# Altium footprint library DrPCB.PcbLib: 910 footprints (part 19 of 57)
Each footprint in its own frame and in the unit in brackets; x right, y up, seen from the top. Pads: shape width x height; smd on the part's side, far side on the other; paste and mask are expansions set on the pad; w line width, h text height; cw(c..) or ccw(c..) is an arc to the next point about the centre after c.
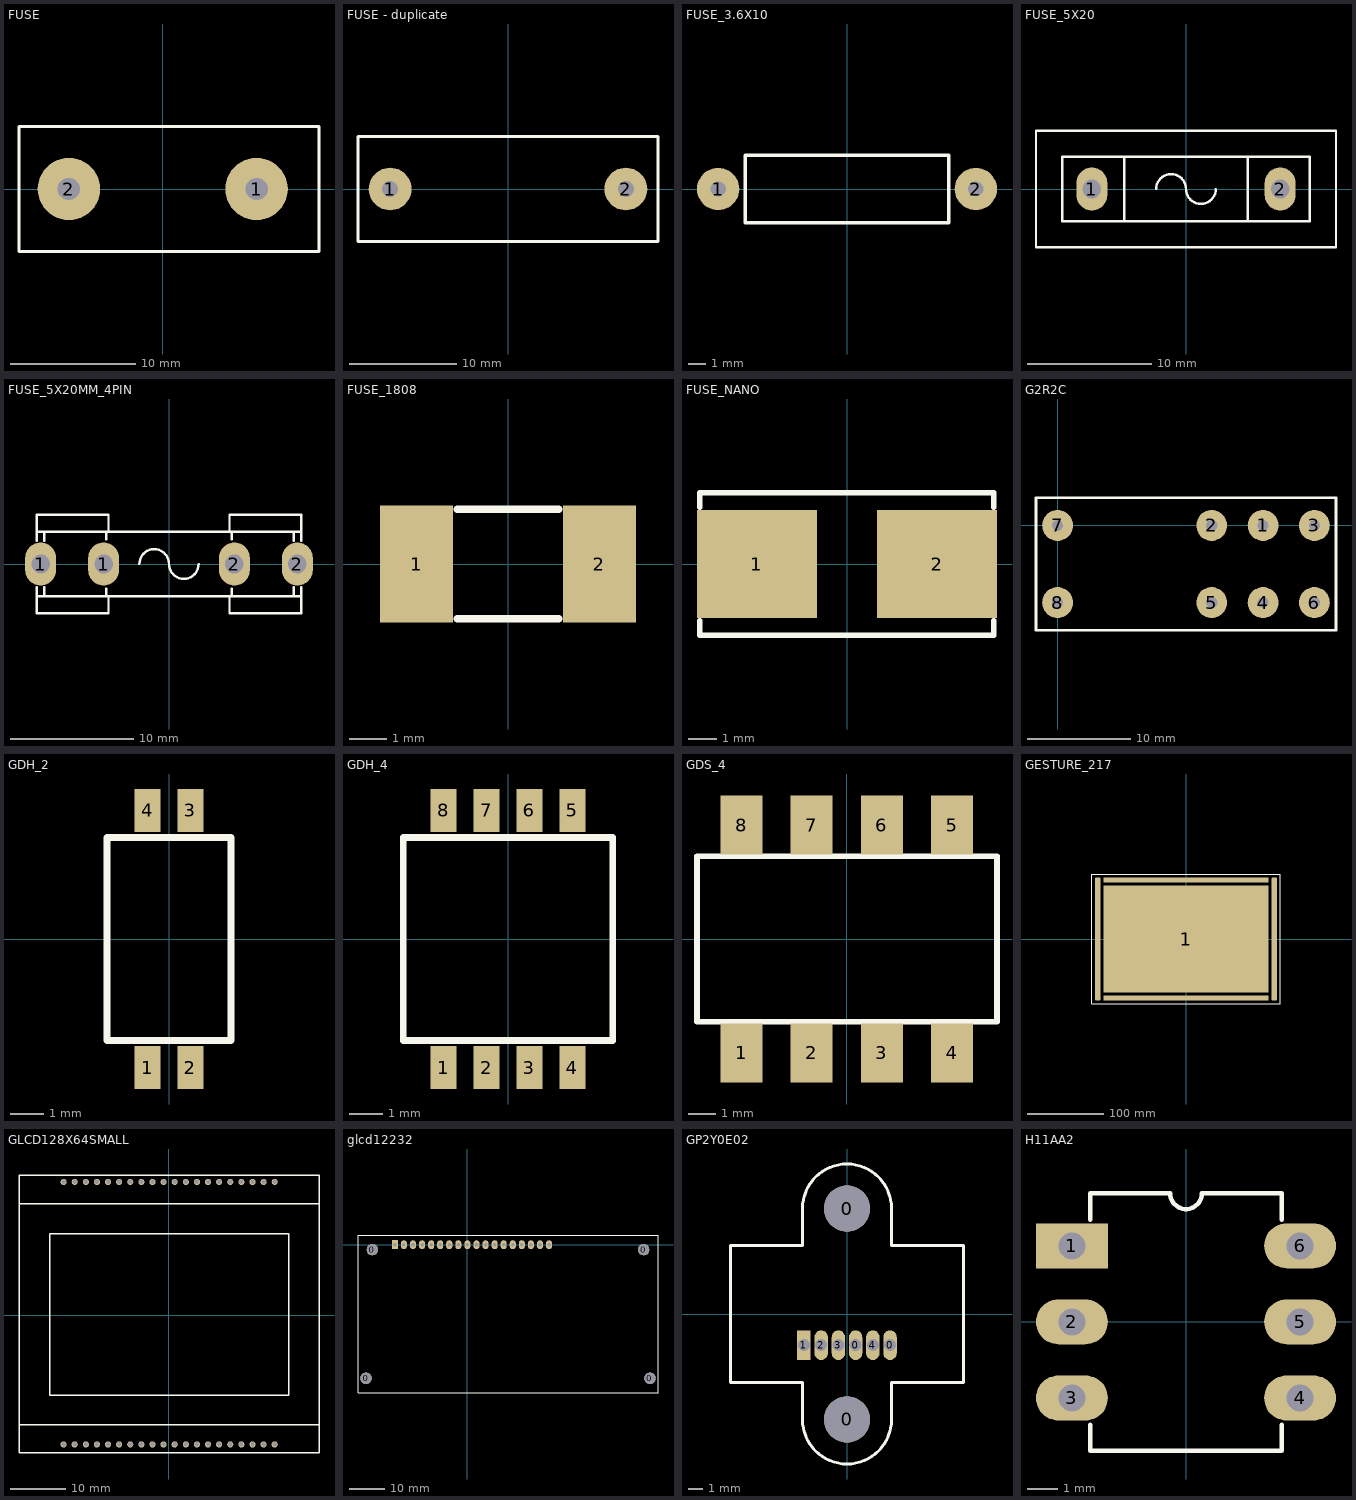
[diagram p18: the footprints below, top view; thin cyan lines are the x and y axes]

## FUSE [mm]
pads (2):
  round 5 hole 1.8 unplated: 1(7.5,0) 2(-7.5,0)
Top Overlay:
  lines w0.254: -11.5,-5 -11.5,5 12.5,5 12.5,-4.998 12.498,-5 -11.5,-5

## FUSE - duplicate [mm]
pads (2):
  round 4 hole 1.5: 1(-11,0) 2(11,0)
Top Overlay:
  lines w0.254: -14,-4.9 14,-4.9 14,4.9 -14,4.9 -14,-4.9

## FUSE_3.6X10 [mm]
pads (2):
  round 2.5 hole 0.9: 1(-7.6,0) 2(7.6,0)
Top Overlay:
  lines w0.2: -6,-2 6,-2 6,2 -6,2 -6,-2
3D body "User Library-_model1.step": height 3.8, standoff -3, extent -8.036,-1.8 8.036,1.8

## FUSE_5X20 [mm] "PCB Fuse Holder 5x20mm 2 PIN, pitch: 15.0mm  24x9mm"
height 10
pads (2):
  oval 2.5x3.5 hole 1.5: 1(-7.6,0) 2(7.6,0)
Top Overlay:
  lines w0.2: -5,-2.6 -5,2.6 ; -2.4,0 cw(c-1.2,0) 0,0 ccw(c1.2,0) 2.4,0 ; 5,-2.6 5,2.6 ; -12.1,-4.7 12.1,-4.7 12.1,4.7 -12.1,4.7 -12.1,-4.7 ; -10,-2.6 10,-2.6 10,2.6 -10,2.6 -10,-2.6
3D body "User Library-FUSIVEL.STEP": height 11.5, standoff 6.5, extent -9.975,-2.475 10.025,2.525
3D body "FUSE-HOLDER.step": height 13.46, standoff -2.4, extent -12,-4.541 12,4.541

## FUSE_5X20MM_4PIN [mm] "PCB Fuse Holder 5x20mm 4 PIN"
height 6
pads (4):
  oval 2.5x3.5 hole 1.5: 1(-10.4,0) 1(-5.3,0) 2(5.3,0) 2(10.4,0)
Top Overlay:
  lines w0.2: -10.7,-2.6 10.7,-2.6 ; -10.7,-1.9 -10.7,-4 -4.9,-4 -4.9,-2.622 ; -10.7,1.9 -10.7,4 -4.9,4 -4.9,2.622 ; -10.7,2.6 10.7,2.6 ; -10.1,-2.6 -10.1,-1.9 ; -10.1,1.9 -10.1,2.6 ; -5.1,-2.6 -5.1,-2 ; -5.1,2 -5.1,2.6 ; -2.4,0 cw(c-1.2,0) 0,0 ccw(c1.2,0) 2.4,0 ; 4.9,-2.622 4.9,-4 10.7,-4 10.7,-1.9 ; 4.9,2.622 4.9,4 10.7,4 10.7,1.9 ; 5.1,-2.6 5.1,-2 ; 5.1,2 5.1,2.6 ; 10.1,-2.6 10.1,-1.9 ; 10.1,1.9 10.1,2.6
3D body "User Library-FH-100.step": height 9.99, standoff -3.5, extent -10.8,-3.5 -5.2,3.5
3D body "User Library-FH-100.step": height 9.99, standoff -3.5, extent 5.2,-3.5 10.8,3.5
3D body "User Library-Fusivel-1.step": height 8.6, standoff 3.4, extent -10,-2.5 10,2.7

## FUSE_1808 [mm]
pads (2):
  rect 1.96x3.15 smd: 1(-2.45,0) 2(2.45,0)
Top Overlay:
  lines w0.2: -1.359,-1.473 1.359,-1.473 ; -1.359,1.473 1.359,1.473
3D body "fuse1.SLDPRT": height 2.71, standoff 0.01, extent -3.048,-1.346 3.049,1.346

## FUSE_NANO [mm]
pads (2):
  rect 4.24x3.81 smd: 1(-3.185,0) 2(3.185,0)
Top Overlay:
  lines w0.2: -5.207,-2.515 -5.207,-2.007 ; -5.207,2.007 -5.207,2.515 ; -5.194,-2.515 5.194,-2.515 5.194,-2.007 ; -5.194,2.515 5.194,2.515 5.194,2.007
3D body "fuse1.SLDPRT": height 2.71, standoff 0.01, extent -3.048,-1.346 3.049,1.346

## G2R2C [mm]
pads (8):
  round 3 hole 1.1: 1(20,0) 2(15,0) 3(25,0) 4(20,-7.5) 5(15,-7.5) 6(25,-7.5) 7(0,0) 8(0,-7.5)
Top Overlay:
  lines w0.254: -2.1,-10.2 27.1,-10.2 27.1,2.7 -2.1,2.7 -2.1,-10.2

## GDH_2 [mm]
pads (4):
  rect 0.76x1.27 smd: 1(-0.635,-3.8) 2(0.635,-3.8) 3(0.635,3.8) 4(-0.635,3.8)
Top Overlay:
  lines w0.2: 1.829,-3 -1.83,-3 -1.83,3 1.829,3 ; 1.83,-3 1.83,3

## GDH_4 [mm]
pads (8):
  rect 0.76x1.27 smd: 1(-1.905,-3.8) 2(-0.635,-3.8) 3(0.635,-3.8) 4(1.905,-3.8) 5(1.905,3.8) 6(0.635,3.8) 7(-0.635,3.8) 8(-1.905,3.8)
Top Overlay:
  lines w0.2: -3.1,-3 -3.1,3 3.1,3 3.1,-3 -3.1,-3
3D body "1571983-4.stp": height 1.75, standoff -0.56, extent -3.099,-4.064 3.099,4.064

## GDS_4 [mm]
pads (8):
  rect 1.52x2.145 smd: 1(-3.81,-4.122) 2(-1.27,-4.122) 3(1.27,-4.122) 4(3.81,-4.122) 5(3.81,4.122) 6(1.27,4.122) 7(-1.27,4.122) 8(-3.81,4.122)
Top Overlay:
  lines w0.2: -5.423,-3 5.436,-3 5.436,3 -5.423,3 -5.423,-3
3D body "User Library-DM04V.step": height 4.53, standoff 0.01, extent -5.55,-4.89 5.55,4.89

## GESTURE_217 [mm]
pads (5):
  rect 217x140 smd: 1(0,0)
  rrect50% 217x7 smd: 2(0,77.5) 4(0,-77.5)
  rrect50% 7x162 smd: 3(116,0) 5(-116,0)
Top Overlay:
  lines w0.1: -123.5,-85 123.5,-85 123.5,85 -123.5,85 -123.5,-85

## GLCD128X64SMALL [mm]
pads (40):
  round 1.1 hole 0.8: 0(-18.909,23.959) 0(-16.909,23.959) 0(-14.909,23.959) 0(-12.909,23.959) 0(-10.909,23.959) 0(-8.909,23.959) 0(-6.909,23.959) 0(-4.909,23.959) 0(-2.909,23.959) 0(-0.909,23.959) 0(1.091,23.959) 0(3.091,23.959) 0(5.091,23.959) 0(7.091,23.959) 0(9.091,23.959) 0(11.091,23.959) 0(13.091,23.959) 0(15.091,23.959) 0(17.091,23.959) 0(19.091,23.959) 1(19.089,-23.285) 2(17.089,-23.285) 3(15.089,-23.285) 4(13.089,-23.285) 5(11.089,-23.285) 6(9.089,-23.285) 7(7.089,-23.285) 8(5.089,-23.285) 9(3.089,-23.285) 10(1.089,-23.285) 11(-0.911,-23.285) 12(-2.911,-23.285) 13(-4.911,-23.285) 14(-6.911,-23.285) 15(-8.911,-23.285) 16(-10.911,-23.285) 17(-12.911,-23.285) 18(-14.911,-23.285) 19(-16.911,-23.285) 20(-18.911,-23.285)
Top Overlay:
  lines w0.254: -26.937,-19.729 27.063,-19.729 ; -26.937,20.022 27.063,20.022 ; -26.937,-24.809 -26.937,25.191 27.063,25.191 27.063,-24.809 -26.937,-24.809 ; -21.398,-14.395 21.602,-14.395 21.602,14.605 -21.398,14.605 -21.398,-14.395

## glcd12232 [mm]
pads (22):
  round 3.2 hole 3.1: 0(-28.373,-37.4) 0(-26.623,-1.4) 0(49.377,-1.4) 0(51.127,-37.4)
  rect 1.7x2.5 hole 1: 1(-20.305,0)
  oval 1.7x2.5 hole 1: 2(-17.765,0) 3(-15.225,0) 4(-12.685,0) 5(-10.145,0) 6(-7.605,0) 7(-5.065,0) 8(-2.525,0) 9(0.015,0) 10(2.555,0) 11(5.095,0) 12(7.635,0) 13(10.175,0) 14(12.715,0) 15(15.255,0) 16(17.795,0) 17(20.335,0) 18(22.875,0)
Top Overlay:
  lines w0.254: -30.623,-41.4 -30.623,2.6 53.377,2.6 53.377,-41.4 -30.623,-41.4

## GP2Y0E02 [mm]
pads (8):
  round 3.1 hole 3.1: 0(0,-7.1) 0(0,7.1)
  oval 0.9x2 hole 0.8: 0(0.58,-2.1) 0(2.9,-2.1) 2(-1.74,-2.1) 3(-0.58,-2.1) 4(1.74,-2.1)
  rect 0.9x2 hole 0.8: 1(-2.9,-2.1)
Top Overlay:
  lines w0.2: -7.85,-4.6 -7.85,4.6 -3,4.6 -3,7.1 cw(c0,7.1) 3,7.1 3,4.6 7.85,4.6 7.85,-4.6 3,-4.6 3,-7.1 cw(c0,-7.1) -3,-7.1 -3,-4.6 -7.85,-4.6

## H11AA2 [mm]
pads (6):
  rect 2.4x1.5 hole 0.9: 1(-3.81,2.54)
  oval 2.4x1.5 hole 0.9: 2(-3.81,0) 3(-3.81,-2.54) 4(3.81,-2.54) 5(3.81,0) 6(3.81,2.54)
Top Overlay:
  lines w0.15: -3.2,3.416 -3.2,4.3 -0.531,4.3 ccw(c0,4.3) 0.531,4.3 3.2,4.3 3.2,3.416 ; -3.2,-3.429 -3.2,-4.3 3.2,-4.3 3.2,-3.429
3D body "DIP762W50P254L730H410Q6__NA__VISHAY__DIP-6__NA--3DModel-Eagle-1.STEP": height 3.57, standoff -4.09, extent -3.81,-4.3 3.81,4.3